# Altium footprint library bhumishboard.PcbLib: 75 footprints (part 3 of 5)
Each footprint in its own frame and in the unit in brackets; x right, y up, seen from the top. Pads: shape width x height; smd on the part's side, far side on the other; paste and mask are expansions set on the pad; w line width, h text height; cw(c..) or ccw(c..) is an arc to the next point about the centre after c.
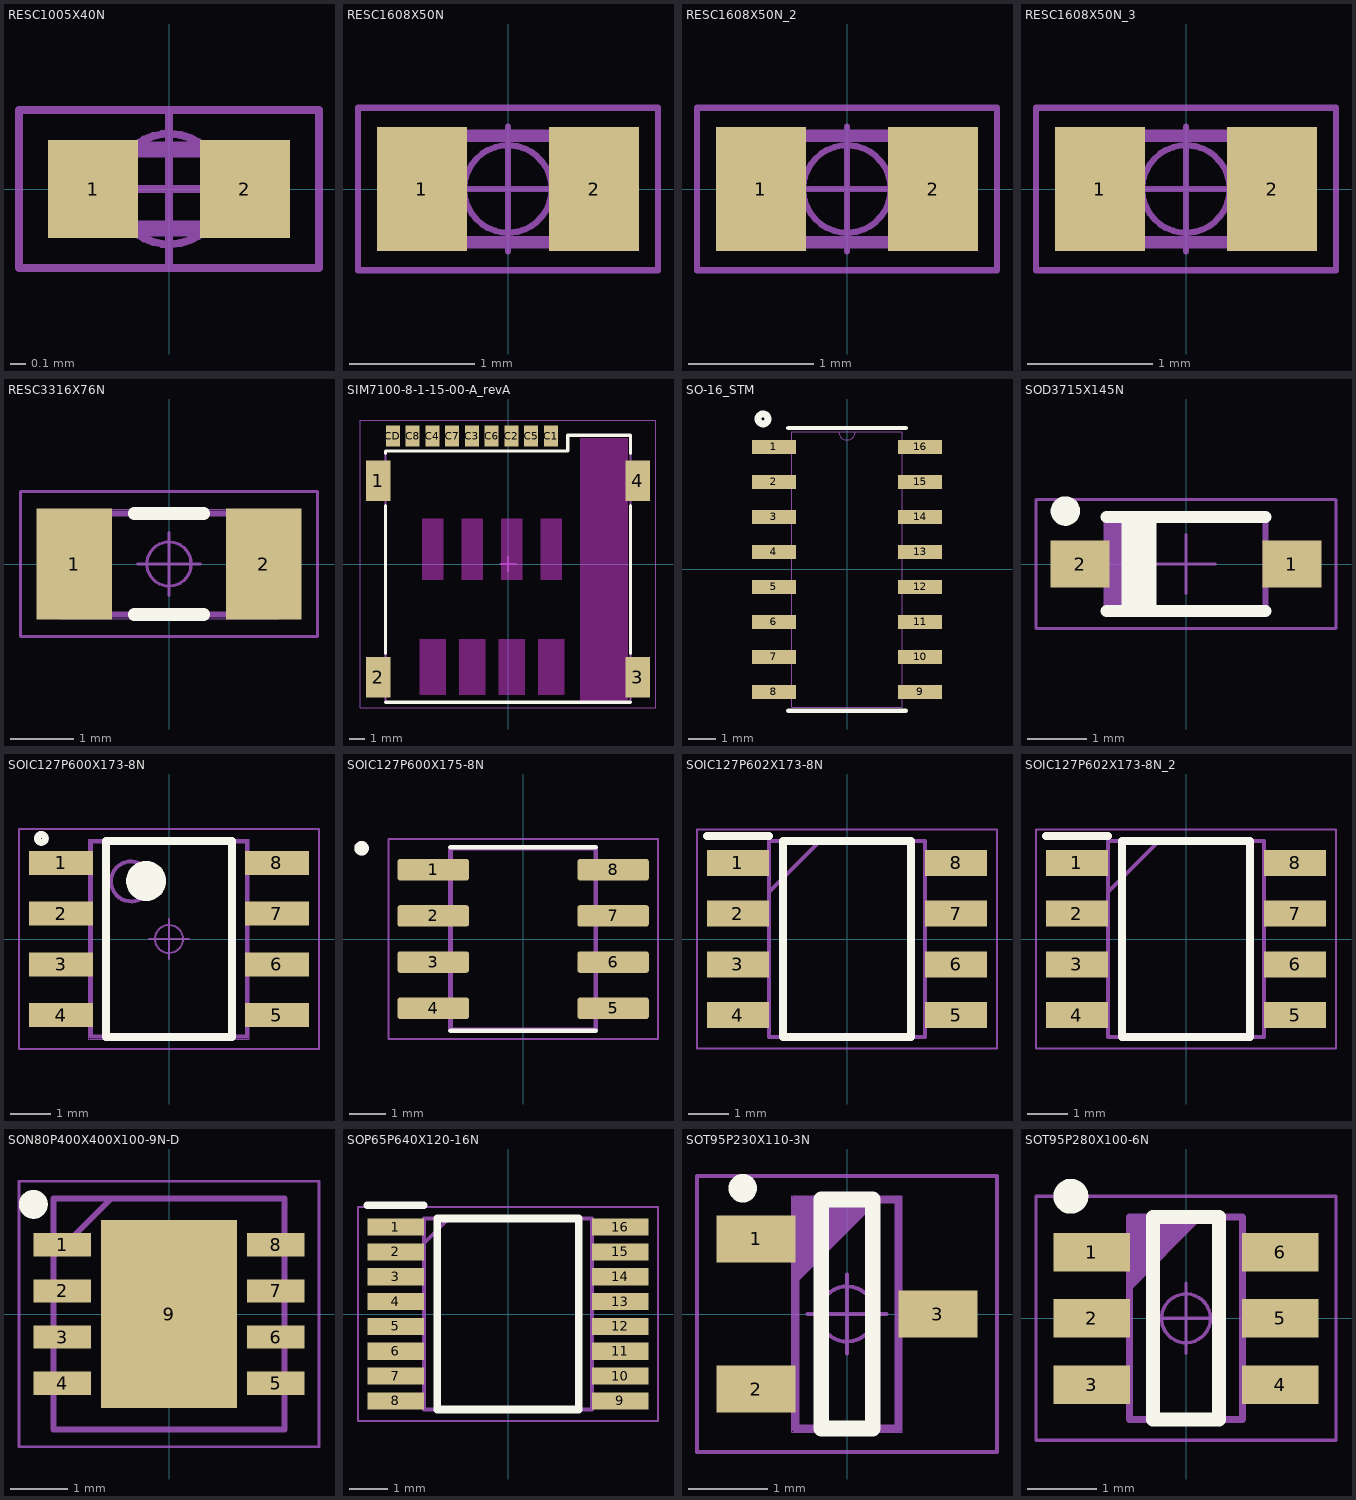
[diagram p2: the footprints below, top view; thin cyan lines are the x and y axes]

## RESC1005X40N [mm]
height 0.35
pads (2):
  rect 0.57x0.62 smd: 1(-0.48,0) 2(0.48,0)
Mechanical 1:
  circle w0.05: c0,0 r0.35
  lines w0.05: -0.5,0 0.5,0 ; 0,-0.5 0,0.5 ; -0.95,-0.5 -0.95,0.5 0.95,0.5 0.95,-0.5 -0.95,-0.5
Mechanical 2:
  lines w0.001: -0.5,-0.25 -0.5,0.25 0.5,0.25 0.5,-0.25 -0.5,-0.25
Mechanical 3:
  lines w0.1: -0.5,-0.25 -0.5,0.25 0.5,0.25 0.5,-0.25 -0.5,-0.25
3D body "User Library-R_0402.step": height 0.35, standoff 0, extent -0.5,-0.25 0.5,0.25

## RESC1608X50N [mm] "Chip Resistor, EIA 0603, Metric 1608, Body 1.6x0.8mm, IPC Medium Density"
height 0.5
pads (2):
  rect 0.72x0.99 smd: 1(-0.69,0) 2(0.69,0)
Mechanical 14:
  lines w0.1: -0.788,-0.425 -0.788,0.425 0.788,0.425 0.788,-0.425 -0.788,-0.425
Mechanical 15:
  circle w0.05: c0,0 r0.35
  lines w0.05: -0.5,0 0.5,0 ; 0,-0.5 0,0.5 ; -1.2,-0.65 -1.2,0.65 1.2,0.65 1.2,-0.65 -1.2,-0.65
3D body "RESC1608X50N.stp": height 0.5, standoff 0, extent -0.875,-0.475 0.875,0.475

## RESC1608X50N_2 [mm]
pads (2):
  rect 0.72x0.99 smd: 1(-0.69,0) 2(0.69,0)
Mechanical 14:
  lines w0.1: -0.788,-0.425 -0.788,0.425 0.788,0.425 0.788,-0.425 -0.788,-0.425
Mechanical 15:
  circle w0.05: c0,0 r0.35
  lines w0.05: -0.5,0 0.5,0 ; 0,-0.5 0,0.5 ; -1.2,-0.65 -1.2,0.65 1.2,0.65 1.2,-0.65 -1.2,-0.65
3D body "RESC1608X50N.stp": height 0.5, standoff 0, extent -0.875,-0.475 0.875,0.475

## RESC1608X50N_3 [mm]
pads (2):
  rect 0.72x0.99 smd: 1(-0.69,0) 2(0.69,0)
Mechanical 14:
  lines w0.1: -0.788,-0.425 -0.788,0.425 0.788,0.425 0.788,-0.425 -0.788,-0.425
Mechanical 15:
  circle w0.05: c0,0 r0.35
  lines w0.05: -0.5,0 0.5,0 ; 0,-0.5 0,0.5 ; -1.2,-0.65 -1.2,0.65 1.2,0.65 1.2,-0.65 -1.2,-0.65
3D body "RESC1608X50N.stp": height 0.5, standoff 0, extent -0.875,-0.475 0.875,0.475

## RESC3316X76N [mm]
height 0.6
pads (2):
  rect 1.2x1.75 smd: 1(-1.5,0) 2(1.5,0)
Top Overlay:
  lines w0.2: -0.55,-0.8 0.55,-0.8 ; -0.55,0.8 0.55,0.8
Mechanical 1:
  circle w0.05: c0,0 r0.35
  lines w0.05: -0.5,0 0.5,0 ; 0,-0.5 0,0.5 ; -2.35,-1.15 -2.35,1.15 2.35,1.15 2.35,-1.15 -2.35,-1.15
Mechanical 2:
  lines w0.001: -1.725,-0.865 -1.725,0.865 1.725,0.865 1.725,-0.865 -1.725,-0.865
Mechanical 3:
  lines w0.1: -1.63,-0.8 -1.63,0.8 1.63,0.8 1.63,-0.8 -1.63,-0.8
3D body: height 0.6, standoff 0, extent -1.725,-0.865 1.725,0.865

## SIM7100-8-1-15-00-A_revA [mm] "Micro SIM Card Connector - Push-Push Type, 8 Pin, SMT, 1.50mm Profile"
height 1.5
pads (13):
  rect 1.56x2.61 smd: 1(-8.34,5.34) 2(-8.34,-7.29) 3(8.34,-7.29) 4(8.34,5.34)
  rect 0.9x1.35 smd: C1(2.755,8.215) C2(0.215,8.215) C3(-2.325,8.215) C4(-4.865,8.215) C5(1.485,8.215) C6(-1.055,8.215) C7(-3.595,8.215) C8(-6.135,8.215) CD(-7.405,8.215)
Top Overlay:
  lines w0.2: -7.875,-8.89 7.875,-8.89 ; -7.875,-5.75 -7.875,3.75 ; -7.875,7.1 -7.875,7.27 3.84,7.27 3.84,8.28 7.875,8.28 7.875,7.1 ; 7.875,-5.75 7.875,3.75
Keep-Out Layer:
  rectangle: 1.925,-8.41 3.625,-4.83
  rectangle: -0.615,-8.41 1.085,-4.83
  rectangle: -3.155,-8.41 -1.455,-4.83
  rectangle: -5.695,-8.41 -3.995,-4.83
  rectangle: 2.075,-1.03 3.475,2.91
  rectangle: -0.465,-1.03 0.935,2.91
  rectangle: -3.005,-1.03 -1.605,2.91
  rectangle: -5.545,-1.03 -4.145,2.91
  rectangle: 4.615,-8.89 7.705,8.11
Mechanical 13:
  lines w0.1: -7.875,-8.89 -7.875,7.27 3.84,7.27 3.84,8.28 7.875,8.28 7.875,-8.89 -7.875,-8.89
Mechanical 15:
  lines w0.05: -9.5,-9.25 9.5,-9.25 9.5,9.25 -9.5,9.25 -9.5,-9.25
  lines w0.1: -0.5,0 0.5,0 ; 0,-0.5 0,0.5
3D body "sim7100-8-1-15-00-a_reva.step": height 1.47, standoff -0.03, extent -8.375,-8.89 8.375,8.44

## SO-16_STM [mil]
pads (16):
  rect 63x20 smd: 1(-104.5,175) 2(-104.5,125) 3(-104.5,75) 4(-104.5,25) 5(-104.5,-25) 6(-104.5,-75) 7(-104.5,-125) 8(-104.5,-175) 9(104.5,-175) 10(104.5,-125) 11(104.5,-75) 12(104.5,-25) 13(104.5,25) 14(104.5,75) 15(104.5,125) 16(104.5,175)
Top Overlay:
  circle w10: c-120,215 r7.07
  lines w6: -84,-202 84,-202 ; -84,202 84,202
Mechanical 1:
  lines w1: -12,197 ccw(c0,197) 12,197 ; -122,-184 -122,-166 -79,-166 -79,-184 -122,-184 ; -122,-134 -122,-116 -79,-116 -79,-134 -122,-134 ; -122,-84 -122,-66 -79,-66 -79,-84 -122,-84 ; -122,-34 -122,-16 -79,-16 -79,-34 -122,-34 ; -122,16 -122,34 -79,34 -79,16 -122,16 ; -122,66 -122,84 -79,84 -79,66 -122,66 ; -122,116 -122,134 -79,134 -79,116 -122,116 ; -122,166 -122,184 -79,184 -79,166 -122,166 ; -79,-197 79,-197 79,197 -79,197 -79,-197 ; 79,-184 79,-166 122,-166 122,-184 79,-184 ; 79,-134 79,-116 122,-116 122,-134 79,-134 ; 79,-84 79,-66 122,-66 122,-84 79,-84 ; 79,-34 79,-16 122,-16 122,-34 79,-34 ; 79,16 79,34 122,34 122,16 79,16 ; 79,66 79,84 122,84 122,66 79,66 ; 79,116 79,134 122,134 122,116 79,116 ; 79,166 79,184 122,184 122,166 79,166
3D body "SO-16_STM.step": height 69.09, standoff 0, extent -122,-197 122.01,197.01

## SOD3715X145N [mm] "SOD Diode (SOD-123); 2.70mm W X 1.55mm L X 1.45mm H body, IPC Medium Density"
height 1.45
pads (2):
  rect 1x0.8 smd: 1(1.8,0) 2(-1.8,0)
Top Overlay:
  circle w0.25: c-2.05,0.9 r0.125
  lines w0.2: -1.35,-0.8 1.35,-0.8 ; -1.35,0.8 1.35,0.8 ; -1,-0.8 -1,0.8 ; -0.8,-0.8 -0.8,0.8 ; -0.6,-0.8 -0.6,0.8
Mechanical 14:
  lines w0.1: -1.25,-0.775 -1.25,0.775 ; -1.15,-0.775 -1.15,0.775 ; -1.05,-0.775 -1.05,0.775 ; -0.95,-0.775 -0.95,0.775 ; -0.85,-0.775 -0.85,0.775 ; -0.75,-0.775 -0.75,0.775 ; -0.65,-0.775 -0.65,0.775 ; -1.35,-0.775 1.35,-0.775 1.35,0.775 -1.35,0.775 -1.35,-0.775
Mechanical 15:
  lines w0.05: -0.5,0 0.5,0 ; 0,-0.5 0,0.5 ; -2.55,-1.1 2.55,-1.1 2.55,1.1 -2.55,1.1 -2.55,-1.1
3D body "SOD3715X145N(SOD123).stp": height 1.45, standoff 0, extent -1.95,-0.85 1.95,0.85

## SOIC127P600X173-8N [mm]
height 1.75
pads (8):
  rect 1.6x0.6 smd: 1(-2.7,1.905) 2(-2.7,0.635) 3(-2.7,-0.635) 4(-2.7,-1.905) 5(2.7,-1.905) 6(2.7,-0.635) 7(2.7,0.635) 8(2.7,1.905)
Top Overlay:
  circle w0.17: c-3.191,2.515 r0.1
  circle w0.5: c-0.575,1.45 r0.25
  lines w0.2: -1.575,-2.45 -1.575,2.45 1.575,2.45 1.575,-2.45 -1.575,-2.45
Mechanical 1:
  circle w0.05: c0,0 r0.35
  lines w0.05: -0.5,0 0.5,0 ; 0,-0.5 0,0.5 ; -3.75,-2.75 -3.75,2.75 3.75,2.75 3.75,-2.75 -3.75,-2.75
Mechanical 2:
  lines w0.001: -2,-2.5 -2,2.5 2,2.5 2,-2.5 -2,-2.5
Mechanical 3:
  circle w0.1: c-0.95,1.44 r0.5
  lines w0.1: -1.95,-2.44 -1.95,2.44 1.95,2.44 1.95,-2.44 -1.95,-2.44
3D body "User Library-SOIC127P500X620X175-8.STEP": height 1.75, standoff 0, extent -3.115,-2.5 3.115,2.5

## SOIC127P600X175-8N [mm]
pads (8):
  rrect25% 1.97x0.59 smd: 1(-2.475,1.905) 2(-2.475,0.635) 3(-2.475,-0.635) 4(-2.475,-1.905) 5(2.475,-1.905) 6(2.475,-0.635) 7(2.475,0.635) 8(2.475,1.905)
Top Overlay:
  circle w0.2: c-4.445,2.495 r0.1
  lines w0.127: -2,-2.52 2,-2.52 ; -2,2.52 2,2.52
Mechanical 13:
  circle w0.2: c-4.445,2.495 r0.1
  lines w0.127: -2,-2.5 -2,2.5 2,2.5 2,-2.5 -2,-2.5
Mechanical 15:
  lines w0.05: -3.71,-2.75 -3.71,2.75 3.71,2.75 3.71,-2.75 -3.71,-2.75
3D body "step_temp.STEP": height 1.75, standoff 0, extent -2.45,-3 2.45,3

## SOIC127P602X173-8N [mm]
pads (8):
  rect 1.55x0.65 smd: 1(-2.725,1.905) 2(-2.725,0.635) 3(-2.725,-0.635) 4(-2.725,-1.905) 5(2.725,-1.905) 6(2.725,-0.635) 7(2.725,0.635) 8(2.725,1.905)
Top Overlay:
  lines w0.2: -3.5,2.58 -1.95,2.58 ; -1.6,-2.445 -1.6,2.445 1.6,2.445 1.6,-2.445 -1.6,-2.445
Mechanical 13:
  lines w0.1: -1.95,1.175 -0.68,2.445 ; -1.95,-2.445 -1.95,2.445 1.95,2.445 1.95,-2.445 -1.95,-2.445
Mechanical 15:
  lines w0.05: -3.75,-2.74 -3.75,2.74 3.75,2.74 3.75,-2.74 -3.75,-2.74
3D body "TLE9251VSJXUMA1.stp": height 1.73, standoff 0, extent -3.01,-2.445 3.01,2.445

## SOIC127P602X173-8N_2 [mm]
pads (8):
  rect 1.55x0.65 smd: 1(-2.725,1.905) 2(-2.725,0.635) 3(-2.725,-0.635) 4(-2.725,-1.905) 5(2.725,-1.905) 6(2.725,-0.635) 7(2.725,0.635) 8(2.725,1.905)
Top Overlay:
  lines w0.2: -3.5,2.58 -1.95,2.58 ; -1.6,-2.445 -1.6,2.445 1.6,2.445 1.6,-2.445 -1.6,-2.445
Mechanical 13:
  lines w0.1: -1.95,1.175 -0.68,2.445 ; -1.95,-2.445 -1.95,2.445 1.95,2.445 1.95,-2.445 -1.95,-2.445
Mechanical 15:
  lines w0.05: -3.75,-2.74 -3.75,2.74 3.75,2.74 3.75,-2.74 -3.75,-2.74
3D body "TLE9251VSJXUMA1.stp": height 1.73, standoff 0, extent -3.01,-2.445 3.01,2.445

## SON80P400X400X100-9N-D [mm]
pads (9):
  rect 1x0.4 smd: 1(-1.85,1.2) 2(-1.85,0.4) 3(-1.85,-0.4) 4(-1.85,-1.2) 5(1.85,-1.2) 6(1.85,-0.4) 7(1.85,0.4) 8(1.85,1.2)
  rect 2.35x3.25 smd: 9(0,0)
Top Overlay:
  circle w0.25: c-2.35,1.9 r0.125
Mechanical 13:
  lines w0.1: -2,1 -1,2 ; -2,-2 -2,2 2,2 2,-2 -2,-2
Mechanical 15:
  lines w0.05: -2.6,-2.3 -2.6,2.3 2.6,2.3 2.6,-2.3 -2.6,-2.3
3D body "A7101CHTK2_T0BC2VJ.stp": height 1, standoff 0, extent -2.05,-2 2.05,2

## SOP65P640X120-16N [mm]
pads (16):
  rect 1.475x0.45 smd: 1(-2.938,2.275) 2(-2.938,1.625) 3(-2.938,0.975) 4(-2.938,0.325) 5(-2.938,-0.325) 6(-2.938,-0.975) 7(-2.938,-1.625) 8(-2.938,-2.275) 9(2.938,-2.275) 10(2.938,-1.625) 11(2.938,-0.975) 12(2.938,-0.325) 13(2.938,0.325) 14(2.938,0.975) 15(2.938,1.625) 16(2.938,2.275)
Top Overlay:
  lines w0.2: -3.675,2.85 -2.2,2.85 ; -1.85,-2.5 -1.85,2.5 1.85,2.5 1.85,-2.5 -1.85,-2.5
Mechanical 13:
  lines w0.1: -2.2,1.85 -1.55,2.5 ; -2.2,-2.5 -2.2,2.5 2.2,2.5 2.2,-2.5 -2.2,-2.5
Mechanical 15:
  lines w0.05: -3.925,-2.8 -3.925,2.8 3.925,2.8 3.925,-2.8 -3.925,-2.8
3D body "74CBTLV3257PGG.stp": height 1.2, standoff 0, extent -3.2,-2.5 3.2,2.5

## SOT95P230X110-3N [mm]
height 1.12
pads (3):
  rect 1x0.6 smd: 1(-1.15,0.95) 2(-1.15,-0.95) 3(1.15,0)
Top Overlay:
  circle w0.2: c-1.321,1.593 r0.08
  lines w0.2: -0.325,-1.45 0.325,-1.45 0.325,1.45 -0.325,1.45 -0.325,-1.45
Mechanical 1:
  circle w0.05: c0,0 r0.35
  lines w0.05: -0.5,0 0.5,0 ; 0,-0.5 0,0.5 ; -1.9,-1.75 1.9,-1.75 1.9,1.75 -1.9,1.75 -1.9,-1.75
Mechanical 2:
  lines w0.001: -0.7,-1.5 0.7,-1.5 0.7,1.5 -0.7,1.5 -0.7,-1.5
Mechanical 3:
  lines w0.1: -0.65,0.45 0.35,1.45 ; -0.65,0.55 0.25,1.45 ; -0.65,0.65 0.15,1.45 ; -0.65,0.75 0.05,1.45 ; -0.65,0.85 -0.05,1.45 ; -0.65,0.95 -0.15,1.45 ; -0.65,1.05 -0.25,1.45 ; -0.65,1.15 -0.35,1.45 ; -0.65,1.25 -0.45,1.45 ; -0.65,1.35 -0.55,1.45 ; -0.65,-1.45 0.65,-1.45 0.65,1.45 -0.65,1.45 -0.65,-1.45
3D body "CircuitWorks-SOT-23.step": height 1.09, standoff 0, extent -1.25,-1.5 1.25,1.5

## SOT95P280X100-6N [mm] "SOT23, 0.95mm pitch; 6 pin, 1.625mm W X 2.90mm L X 1.00mm H body, IPC Medium Density"
height 1
pads (6):
  rect 1.1x0.55 smd: 1(-1.35,0.95) 2(-1.35,0) 3(-1.35,-0.95) 4(1.35,-0.95) 5(1.35,0) 6(1.35,0.95)
Top Overlay:
  circle w0.25: c-1.65,1.75 r0.125
  lines w0.2: -0.475,-1.45 0.475,-1.45 0.475,1.45 -0.475,1.45 -0.475,-1.45
Mechanical 14:
  lines w0.1: -0.812,0.45 0.188,1.45 ; -0.812,0.55 0.088,1.45 ; -0.812,0.65 -0.012,1.45 ; -0.812,0.75 -0.112,1.45 ; -0.812,0.85 -0.212,1.45 ; -0.812,0.95 -0.312,1.45 ; -0.812,1.05 -0.412,1.45 ; -0.812,1.15 -0.512,1.45 ; -0.812,1.25 -0.612,1.45 ; -0.812,1.35 -0.712,1.45 ; -0.812,-1.45 0.812,-1.45 0.812,1.45 -0.812,1.45 -0.812,-1.45
Mechanical 15:
  circle w0.05: c0,0 r0.35
  lines w0.05: -0.5,0 0.5,0 ; 0,-0.5 0,0.5 ; -2.15,-1.75 2.15,-1.75 2.15,1.75 -2.15,1.75 -2.15,-1.75
3D body "SOT95P280X100-6N.stp": height 1, standoff 0, extent -1.4,-1.5 1.4,1.5